# Altium footprint library Pasivos.PcbLib: 138 footprints (part 8 of 9)
Each footprint in its own frame and in the unit in brackets; x right, y up, seen from the top. Pads: shape width x height; smd on the part's side, far side on the other; paste and mask are expansions set on the pad; w line width, h text height; cw(c..) or ccw(c..) is an arc to the next point about the centre after c.
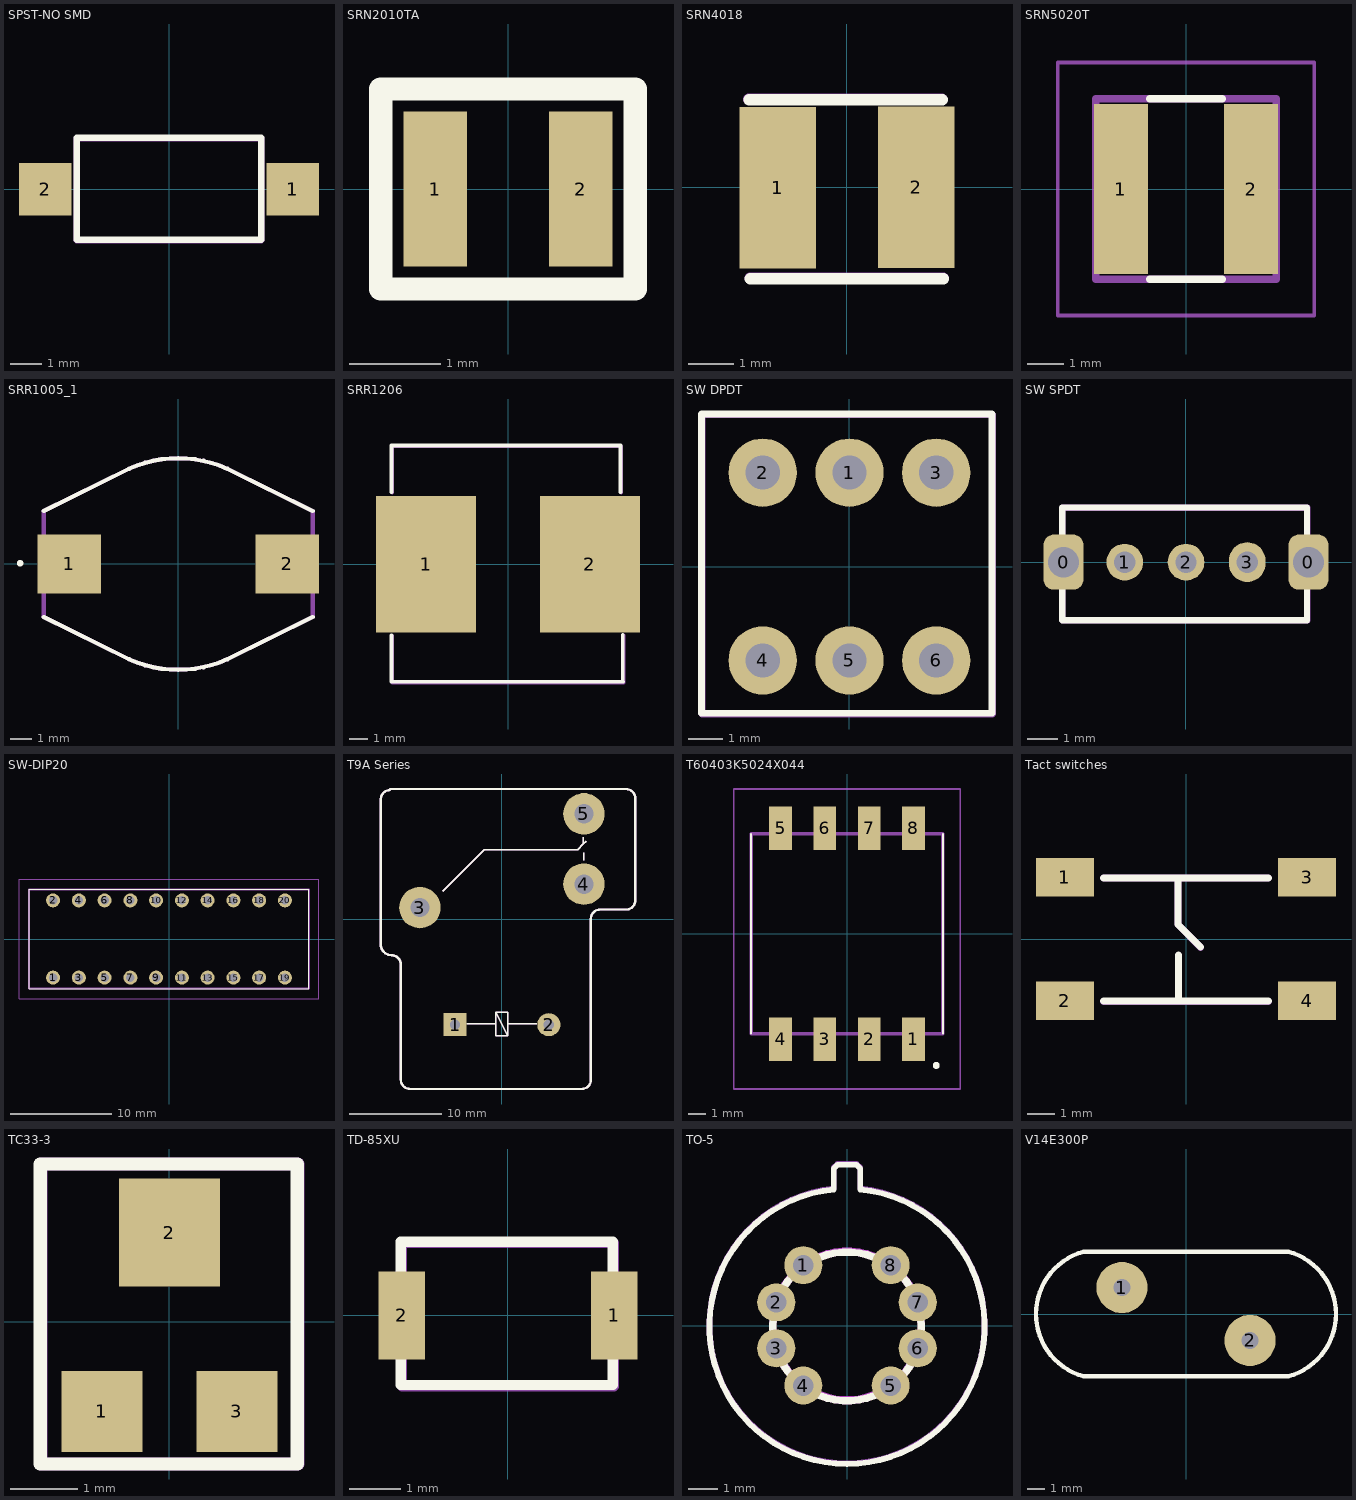
[diagram p7: the footprints below, top view; thin cyan lines are the x and y axes]

## SPST-NO SMD [mm] "Pulsador SMD"
pads (2):
  rect 1.7x1.7 smd: 1(4,0) 2(-4,0)
Top Overlay:
  lines w0.2: -2.985,-1.633 -2.985,1.669 2.984,1.669 2.984,-1.633 -2.985,-1.633
Mechanical 29:
  lines w0.2: -2.985,-1.651 2.984,-1.651 2.984,1.651 -2.985,1.651 -2.985,-1.651
  text "'.Designator'" at -2.748,-0.211 h0.5
3D body "TVBU19.step": height 2.5, standoff 0, extent -3.114,-1.778 2.986,1.922

## SRN2010TA [mm]
pads (2):
  rect 0.7x1.7 smd: 1(-0.8,0) 2(0.8,0)
Top Overlay:
  lines w0.254: -1.4,-1.1 1.4,-1.1 1.4,1.1 -1.4,1.1 -1.4,-1.1
3D body "SRN2010 series.stp": height 1.03, standoff 0.03, extent -1.016,-0.938 0.984,0.807

## SRN4018 [mm] "SRN4018 Series - Semi-shielded Power Inductors"
pads (2):
  rect 1.7x3.6 smd: 1(-1.54,-0.005) 2(1.54,0.005)
Top Overlay:
  lines w0.254: -2.182,1.957 2.118,1.957 ; -2.152,-2.033 2.148,-2.033
Mechanical 29:
  lines w0.254: -2.19,1.965 2.11,1.965 ; -2.16,-2.025 2.14,-2.025
  text "'.Designator'" at -1.981,-0.157 h0.5
3D body "srn4018.stp": height 1.8, standoff 0, extent -2.16,-2.025 2.24,1.975

## SRN5020T [mm] "Fixed Inductors"
pads (2):
  rect 1.5x4.7 smd: 1(-1.8,0) 2(1.8,0)
Top Overlay:
  lines w0.2: -1,-2.5 1,-2.5 ; -1,2.5 1,2.5
Mechanical 13:
  lines w0.2: -2.5,-2.5 -2.5,2.5 2.5,2.5 2.5,-2.5 -2.5,-2.5
Mechanical 15:
  lines w0.1: -3.55,-3.5 -3.55,3.5 3.55,3.5 3.55,-3.5 -3.55,-3.5
3D body "SRN5020TA-4R7M.stp": height 2.1, standoff 0, extent -2.5,-2.5 2.5,2.5

## SRR1005_1 [mm]
pads (2):
  rect 3x2.8 smd: 1(-5.15,0) 2(5.15,0)
Top Overlay:
  circle w0.2: c-7.467,0.036 r0.053
  lines w0.2: -6.35,-2.5 -2.317,-4.5 ; -6.35,2.5 -2.317,4.5 ; -2.313,-4.502 ccw(c0.001,0.623) 2.324,-4.498 ; -2.313,4.502 cw(c0.001,-0.623) 2.324,4.498 ; 2.319,-4.5 6.35,-2.5 ; 2.319,4.5 6.35,2.5
Mechanical 15:
  lines w0.2: -2.317,-4.5 -6.35,-2.5 -6.35,2.5 -2.317,4.5 ; -2.313,-4.502 ccw(c0.001,0.623) 2.324,-4.498 ; -2.313,4.502 cw(c0.001,-0.623) 2.324,4.498 ; 2.319,-4.5 6.35,-2.5 6.35,2.5 2.319,4.5
3D body "Bourns_SRR1005-100M.STEP": height 5.2, standoff -0.1, extent -6.45,-5 6.45,5

## SRR1206 [mm] "SRR1206 Series SMD High Current Inductor"
pads (2):
  rect 5.5x7.5 smd: 1(-4.5,0) 2(4.5,0)
Top Overlay:
  lines w0.2: -6.409,-3.901 -6.409,-6.464 6.341,-6.464 ; -6.409,3.973 -6.409,6.536 6.189,6.536 6.189,3.973 ; 6.316,-6.441 6.316,-3.878
Mechanical 29:
  lines w0.2: -6.375,-3.937 -6.375,-6.5 6.375,-6.5 ; -6.375,3.937 -6.375,6.5 6.223,6.5 6.223,3.937 ; 6.35,-6.477 6.35,-3.914
  text "'.Designator'" at -3.012,-0.146 h0.5
3D body "User Library-DRQ127_12_5x12_5.step": height 8, standoff 0, extent -6.277,-6.15 6.223,6.35

## SW DPDT [mm] "Pulsador doble inversor (PN TL 2201)"
pads (6):
  round 2 hole 1: 1(0,2.75) 2(-2.54,2.75) 3(2.54,2.75) 4(-2.54,-2.75) 5(0,-2.75) 6(2.54,-2.75)
Top Overlay:
  lines w0.2: -4.336,-4.295 4.173,-4.295 4.173,4.468 -4.336,4.468 -4.336,-4.295
Mechanical 29:
  lines w0.2: -4.318,-4.318 -4.318,4.445 4.191,4.445 4.191,-4.318 -4.318,-4.318
  text "'.Designator'" at -2.915,-0.17 h0.5
3D body "TL 2201.step": height 14.02, standoff -3.48, extent -4.191,-4.191 4.309,4.309

## SW SPDT [mm]
pads (5):
  rrect50% 1.3x1.8 hole 1: 0(-4,0) 0(4,0)
  round 1.2 hole 0.7: 1(-2,0) 2(0,0)
  oval 1.2x1.3 hole 0.7: 3(2,0)
Top Overlay:
  lines w0.2: -4.042,-1.9 -4.042,1.783 3.959,1.783 3.959,-1.9 -4.042,-1.9
Mechanical 29:
  lines w0.2: -4.032,-1.905 3.969,-1.905 3.969,1.778 -4.032,1.778 -4.032,-1.905
  text "'.Designator'" at -2.725,-1.524 h0.5

## SW-DIP20 [mm] "Tipo DS01C-254-L-10BE"
pads (20):
  round 1.381 hole 0.85: 1(-11.43,-3.81) 2(-11.43,3.81) 3(-8.89,-3.81) 4(-8.89,3.81) 5(-6.35,-3.81) 6(-6.35,3.81) 7(-3.81,-3.81) 8(-3.81,3.81) 9(-1.27,-3.81) 10(-1.27,3.81) 11(1.27,-3.81) 12(1.27,3.81) 13(3.81,-3.81) 14(3.81,3.81) 15(6.35,-3.81) 16(6.35,3.81) 17(8.89,-3.81) 18(8.89,3.81) 19(11.43,-3.81) 20(11.43,3.81)
Top Overlay:
  lines w0.1: -13.79,-4.89 -13.79,4.89 13.79,4.89 13.79,-4.89 -13.79,-4.89
Mechanical 13:
  lines w0.2: -13.79,-4.89 -13.79,4.89 13.79,4.89 13.79,-4.89 -13.79,-4.89
Mechanical 15:
  lines w0.1: -14.79,-5.89 -14.79,5.89 14.79,5.89 14.79,-5.89 -14.79,-5.89
3D body "CUI_DEVICES_DS01C-254-L-10BE.step": height 6.58, standoff -3.78, extent -13.362,-4.974 13.458,4.926

## T9A Series [mm] "DC Coil 30A PCB or Panel Mount Relay"
pads (5):
  rect 2.5x2.5 hole 1.1: 1(-5.08,-11.43)
  round 2.5 hole 1.1: 2(5.08,-11.43)
  round 4.5 hole 2.1: 3(-8.89,1.27) 4(8.89,3.81) 5(8.89,11.43)
Top Overlay:
  lines w0.152: -6.42,3.03 -1.91,7.54 8.195,7.54 8.83,8.175 ; -3.83,-11.345 -0.655,-11.345 ; 3.79,-11.345 0.615,-11.345 ; 8.83,8.9 8.83,8.175 ; 8.87,6.382 8.87,7.22 ; 9.16,8.48 8.83,8.175 ; -0.655,-11.345 -0.655,-12.615 0.615,-12.615 ; -0.655,-11.345 -0.655,-10.075 ; -0.655,-10.075 0.615,-10.075 0.615,-11.345 ; -0.655,-10.075 0.615,-12.615 ; 0.615,-12.615 0.615,-11.345
  lines w0.254: -13.14,13.05 -13.14,-2.72 ccw(c-11.97,-2.72) -11.97,-3.89 cw(c-11.97,-4.89) -10.97,-4.89 ; -13.13,13.01 cw(c-12.13,13.01) -12.13,14.01 ; -12.13,14.12 13.45,14.12 cw(c13.45,13.12) 14.45,13.12 14.45,2.06 ; -10.96,-4.89 -10.96,-8.023 -10.96,-17.4 ccw(c-9.96,-17.4) -9.96,-18.4 8.68,-18.4 ; 8.64,-18.4 ccw(c8.64,-17.4) 9.64,-17.4 9.64,0.08 ; 9.64,0.05 cw(c10.64,0.05) 10.64,1.05 13.45,1.05 ccw(c13.45,2.05) 14.45,2.05
Bottom Overlay:
  text "NC" at 5.56,10.79 h1.52
  text "NO" at 5.58,3.11 h1.52
  text "C" at -4.49,0.44 h1.52
Mechanical 29:
  lines w0.152: -6.42,3.03 -1.91,7.54 8.195,7.54 8.83,8.175 ; -3.83,-11.345 -0.655,-11.345 ; 3.79,-11.345 0.615,-11.345 ; 8.83,8.9 8.83,8.175 ; 8.87,6.382 8.87,7.22 ; 9.16,8.48 8.83,8.175 ; -0.655,-11.345 -0.655,-10.075 ; -0.655,-11.345 -0.655,-12.615 0.615,-12.615 ; -0.655,-10.075 0.615,-12.615 ; -0.655,-10.075 0.615,-10.075 0.615,-11.345 ; 0.615,-12.615 0.615,-11.345
  lines w0.254: -13.14,13.05 -13.14,-2.72 ccw(c-11.97,-2.72) -11.97,-3.89 cw(c-11.97,-4.89) -10.97,-4.89 ; -13.13,13.01 cw(c-12.13,13.01) -12.13,14.01 ; -12.13,14.12 13.45,14.12 cw(c13.45,13.12) 14.45,13.12 14.45,2.06 ; -10.96,-4.89 -10.96,-8.023 -10.96,-17.4 ccw(c-9.96,-17.4) -9.96,-18.4 8.68,-18.4 ; 8.64,-18.4 ccw(c8.64,-17.4) 9.64,-17.4 9.64,0.08 ; 9.64,0.05 cw(c10.64,0.05) 10.64,1.05 13.45,1.05 ccw(c13.45,2.05) 14.45,2.05
  text "'.Designator'" at -2.983,-16.819 h0.5
3D body "T90R5D12-12.step": height 18.27, standoff -3.5, extent -13.135,-18.28 14.295,13.98

## T60403K5024X044 [mm]
pads (8):
  rect 1.3x2.5 smd: 1(3.81,-6.05) 2(1.27,-6.05) 3(-1.27,-6.05) 4(-3.81,-6.05) 5(-3.81,6.05) 6(-1.27,6.05) 7(1.27,6.05) 8(3.81,6.05)
Top Overlay:
  lines w0.1: -5.5,-5.73 -5.5,5.73 ; 5.5,-5.73 5.5,5.73
  lines w0.2: 5.017,-7.546 ccw(c5.117,-7.546) 5.217,-7.546 ccw(c5.117,-7.546) 5.017,-7.546
Mechanical 15:
  lines w0.2: -5.5,-5.73 -5.5,5.73 5.5,5.73 5.5,-5.73 -5.5,-5.73
Mechanical 16:
  lines w0.1: -6.5,-8.9 -6.5,8.3 6.5,8.3 6.5,-8.9 -6.5,-8.9
3D body "VAC_T60403-K5024-X044.STEP": height 7.6, standoff 0, extent -5.5,-6.985 5.5,6.915

## Tact switches [mm] "6x6 mm tact switches"
pads (4):
  rect 2.1x1.4 smd: 1(-4.4,2.25) 2(-4.4,-2.25) 3(4.4,2.25) 4(4.4,-2.25)
Top Overlay:
  lines w0.254: -3.003,-2.256 2.997,-2.256 ; -3.003,2.224 2.997,2.224 ; -0.293,2.224 -0.293,0.534 0.527,-0.286 ; -0.273,-2.226 -0.273,-0.586
Mechanical 29:
  lines w0.254: -3,-2.27 3,-2.27 ; -3,2.21 3,2.21 ; -0.29,2.21 -0.29,0.52 0.53,-0.3 ; -0.27,-2.24 -0.27,-0.6
  text "'.Designator'" at -4.817,-0.223 h0.5
3D body "Schurter_1301.9318.STEP": height 8, standoff 0, extent -5.04,-2.98 4.96,3.02

## TC33-3 [mm] "SMD Trimpot"
pads (3):
  rect 1.2x1.2 smd: 1(-1,-1.325) 3(1,-1.325)
  rect 1.5x1.6 smd: 2(0,1.325)
Top Overlay:
  lines w0.2: -1.916,-2.104 -1.916,2.341 1.894,2.341 1.894,-2.104 -1.916,-2.104
Mechanical 29:
  lines w0.2: -1.905,-2.104 1.905,-2.104 1.905,2.341 -1.905,2.341 -1.905,-2.104
  text "'.Designator'" at -1.66,-0.344 h0.5
3D body "TRIMMER_PVG3A.STEP": height 2, standoff 0, extent -1.7,-1.767 1.7,1.833

## TD-85XU [mm] "Pulsador SMD"
pads (2):
  rect 0.9x1.7 smd: 1(2.05,0) 2(-2.05,0)
Top Overlay:
  lines w0.2: -2.075,-1.345 2.025,-1.345 2.025,1.425 -2.075,1.425 -2.075,-1.345
Mechanical 29:
  lines w0.2: -2.05,-1.37 -2.05,1.4 2.05,1.4 2.05,-1.37 -2.05,-1.37
  text "'.Designator'" at -1.774,-0.156 h0.5

## TO-5 [mm] "Relay Teledyne SERIES 712"
pads (8):
  round 1.3 hole 0.7: 1(-1.493,2.063) 2(-2.416,0.793) 3(-2.416,-0.777) 4(-1.493,-2.047) 5(1.493,-2.047) 6(2.416,-0.777) 7(2.416,0.793) 8(1.493,2.063)
Top Overlay:
  lines w0.2: -0.45,4.651 ccw(c0,-0.027) 0.45,4.651 0.45,5.364 0.324,5.491 -0.324,5.491 -0.45,5.364 -0.45,4.651
Top Overlay keep-out:
  circle w0.254: c0,-0.027 r2.54
Mechanical 29:
  lines w0.2: -0.45,4.678 ccw(c0,0) 0.45,4.678 0.45,5.392 0.324,5.518 -0.324,5.518 -0.45,5.392 -0.45,4.678
  text "'.Designator'" at -1.981,-0.167 h0.5
Mechanical 29 keep-out:
  circle w0.254: c0,0 r2.54
3D body "TO-5.STEP": height 9.3, standoff -1.5, extent -4.953,-5.057 5.045,5.311

## V14E300P [mm]
pads (2):
  round 3 hole 1: 1(-3.75,1.55) 2(3.75,-1.55)
Top Overlay:
  lines w0.254: -6,-3.65 cw(c-5,0) -6,3.65 6,3.65 cw(c5,0) 6,-3.65 -6,-3.65
3D body "VARISTOR DISC 14MM.step": height 19, standoff -24, extent -8,-2.794 8,2.706